# Altium footprint library PCBLIB.PcbLib: 775 footprints (part 14 of 49)
Each footprint in its own frame and in the unit in brackets; x right, y up, seen from the top. Pads: shape width x height; smd on the part's side, far side on the other; paste and mask are expansions set on the pad; w line width, h text height; cw(c..) or ccw(c..) is an arc to the next point about the centre after c.
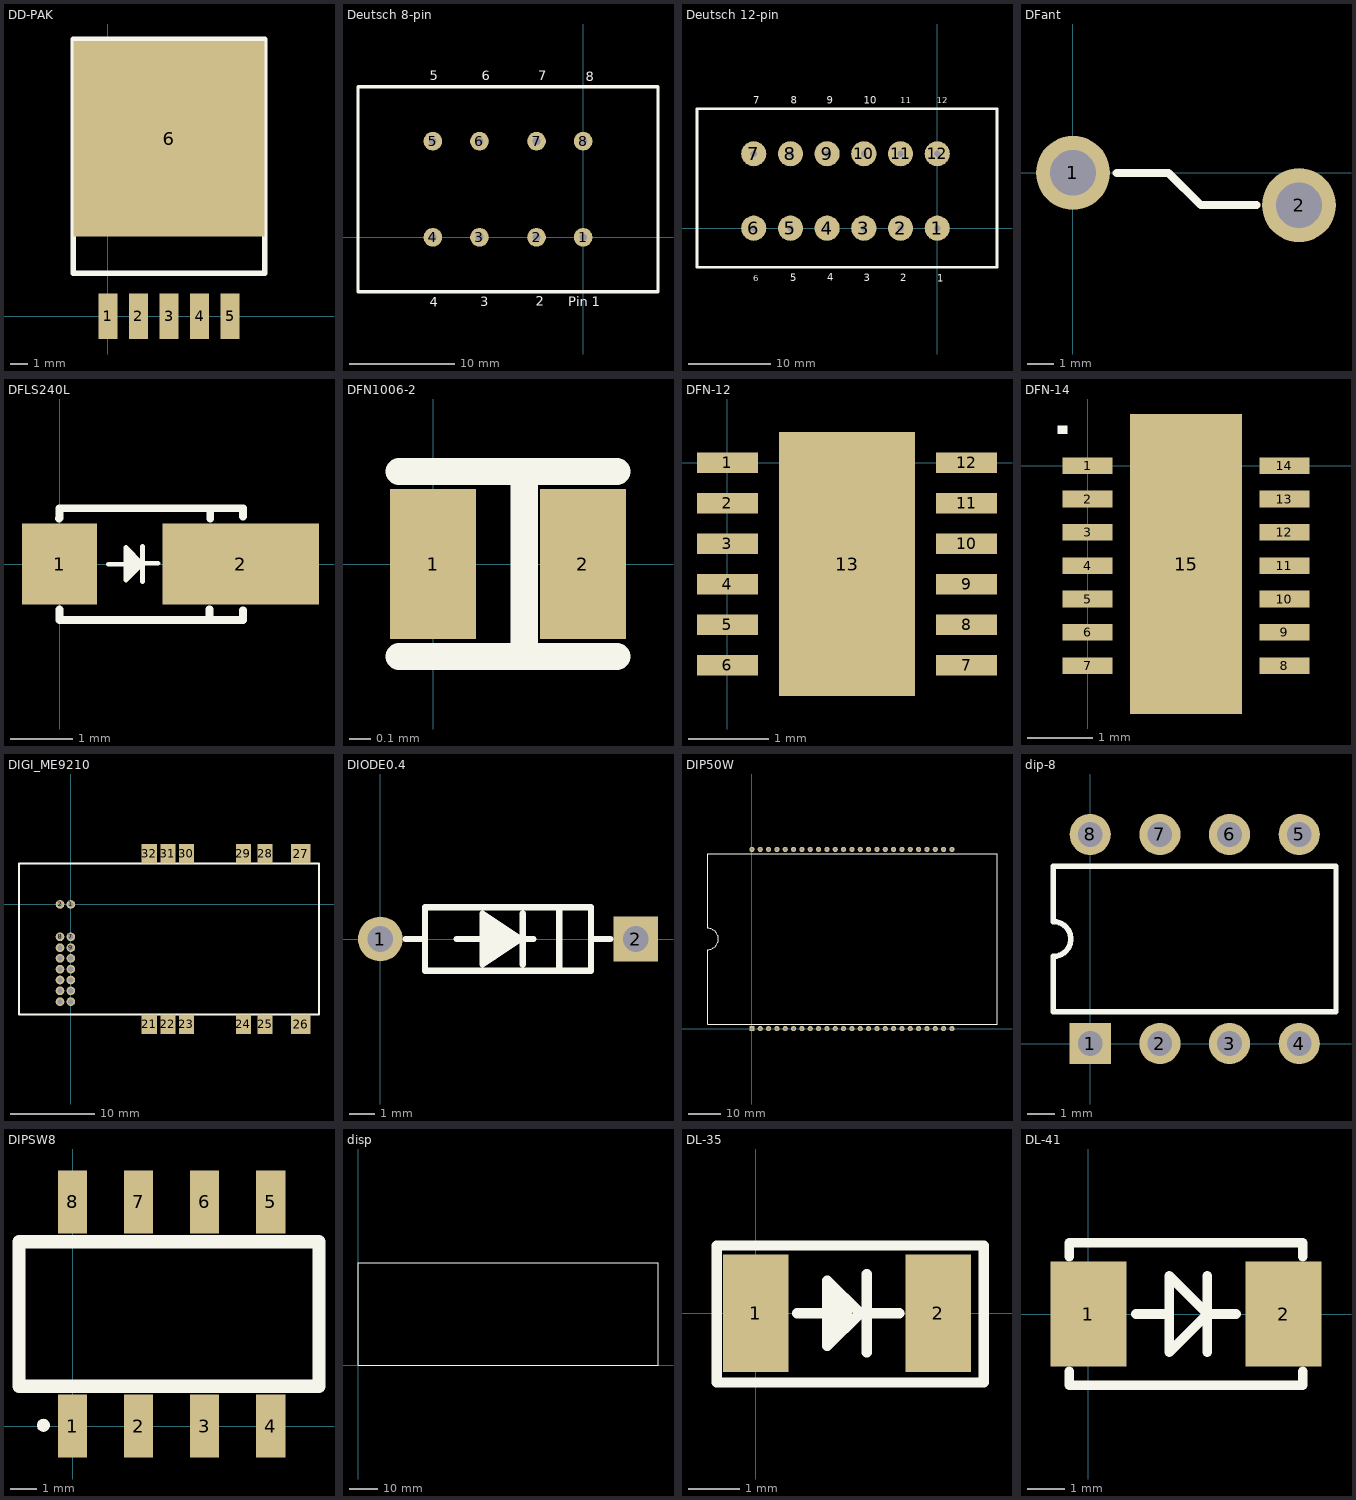
[diagram p13: the footprints below, top view; thin cyan lines are the x and y axes]

## DD-PAK [mil]
pads (6):
  rect 42x100 smd: 1(0,0) 2(67,0) 3(134,0) 4(201,0) 5(268,0)
  rect 420x430 smd: 6(134,390)
TopOverlay:
  lines w12: -76,94 344,94 344,609 -76,609 -76,94
  text "." at -71,-2 h80
Mechanical4:
  text ".110" at 15.6,0.2 h1
  text ".175" at 16,0 h1

## Deutsch 8-pin [mil]
pads (8):
  round 70 hole 29: 1(0,0) 2(-175,0) 3(-389,0) 4(-564,0) 5(-564,361) 6(-389,361) 7(-175,361) 8(0,361)
TopOverlay:
  lines w12: -845,-204.5 281,-204.5 281,565.5 -845,565.5 -845,-204.5
  text "8" at 10,586 h35
  text "4" at -575,-261 h35
  text "3" at -387,-259 h35
  text "2" at -178,-256 h35
  text "5" at -575,589 h35
  text "6" at -380,589 h35
  text "7" at -169,589 h35
  text "Pin 1" at -56,-258 h35

## Deutsch 12-pin [mil]
pads (12):
  round 120 / inner round 70 / far side round 70 hole 29: 1(0,0) 2(-175,0) 3(-350,0) 4(-525,0) 5(-700,0) 6(-875,0) 7(-875,355) 8(-700,355) 9(-525,355) 10(-350,355) 11(-175,355) 12(0,355)
TopOverlay:
  lines w12: -1145.5,-186 285,-186 285,570 -1145.5,570 -1145.5,-186
  text "12" at -2,596 h30
  text "11" at -176,595 h30
  text "6" at -877,-253 h30
  text "5" at -701,-253 h35
  text "8" at -699,593 h35
  text "4" at -525,-250 h35
  text "3" at -351,-253 h35
  text "2" at -177,-253 h35
  text "9" at -527,594 h35
  text "10" at -351,594 h35
  text "7" at -877,593 h35
  text "1" at 0,-255 h35

## DFant [mil]
height 1
pads (2):
  round 110 hole 68: 1(0,0) 2(336,-48)
TopOverlay:
  lines w12: 65,0 142,0 190,-48 273,-48

## DFLS240L [mil]
height 39.37
pads (2):
  rect 47.56x51.34 smd: 1(0,0)
  rect 99.13x51.34 smd: 2(114.69,0)
TopOverlay:
  lines w3: 30.87,-0.11 52.19,-0.11 42.02,-10.28 ; 44.17,4.58 42.02,2.43 42.02,-10.28 ; 44.17,6.15 47.3,3.02 ; 44.36,-5.2 47.49,-2.07 ; 44.36,-4.02 44.36,3.02 ; 46.12,1.84 46.52,1.45 ; 48.28,-0.5 48.28,2.24 ; 52.19,0.28 42.02,10.45 42.02,-10.28 ; 52.58,-11.26 52.58,11.23 ; 52.58,0.47 62.36,0.47
  lines w5: -0.24,28.84 0,29.07 0,35.29 116.22,35.29 ; -0.04,-28.87 -0.04,-35.57 116.22,-35.57 116.22,-29.32 116.15,-29.26 ; 95.03,-28.67 95.03,-35.18 95.42,-35.57 ; 95.42,28.84 95.42,35.29 ; 116.15,30.01 116.15,35.25

## DFN1006-2 [mm] "Fast Switching Diode"
height 55
pads (2):
  rect 0.4x0.7 smd: 1(0,0) 2(0.7,0)
TopOverlay:
  lines w0.127: -0.158,-0.432 0.858,-0.432 ; -0.158,0.432 0.858,0.432 ; 0.426,-0.432 0.426,0.432

## DFN-12 [mil]
height 31
pads (13):
  rect 30x10 smd: 1(0,0) 2(0,-20) 3(0,-40) 4(0,-60) 5(0,-80) 6(0,-100) 7(118,-100) 8(118,-80) 9(118,-60) 10(118,-40) 11(118,-20) 12(118,0)
  rect 67x130 smd: 13(59,-50)

## DFN-14 [mil]
pads (15):
  rect 30x10 smd: 1(0,0) 2(0,-20) 3(0,-40) 4(0,-60) 5(0,-80) 6(0,-100) 7(0,-120) 8(118,-120) 9(118,-100) 10(118,-80) 11(118,-60) 12(118,-40) 13(118,-20) 14(118,0)
  rect 67x180 smd: 15(59,-59)
TopOverlay:
  rectangle: -18,19 -12,24

## DIGI_ME9210 [mil]
height 145
pads (28):
  round 40 hole 25: 1(0,0) 2(-50,0) 7(0,-150) 8(-50,-150) 9(0,-200) 10(-50,-200) 11(0,-250) 12(-50,-250) 13(0,-300) 14(-50,-300) 15(0,-350) 16(-50,-350) 17(0,-400) 18(-50,-400) 19(0,-450) 20(-50,-450)
  rect 71x91 smd: 21(364,-555.5) 22(450,-555.5) 23(536,-555.5) 24(800,-555.5) 25(900,-555.5) 28(900,235.5) 29(800,235.5) 30(536,235.5) 31(450,235.5) 32(364,235.5)
  rect 91x91 smd: 26(1065.5,-555.5) 27(1065.5,235.5)
TopOverlay:
  lines w8: -240,-510 -240,190 -29.22,190 1150,190 1150,-510 -85.07,-510 -238.65,-510 -240,-508.65
BottomOverlay:
  text "." at 29.18,-19.23 h300
  text "1" at 23.89,33.72 h60
  text "2" at -32.09,30.7 h60
  text "20" at -31.33,-529.11 h60
  text "19" at 23.13,-528.35 h60
  text "7" at 20.86,-122.87 h60
  text "8" at -32.09,-123.63 h60

## DIODE0.4 [mil]
pads (2):
  round 70 hole 40: 1(0,0)
  rect 70x70 hole 40: 2(400,0)
TopOverlay:
  lines w10: 40,0 70,0 ; 120,0 160,0 200,0 ; 164,31 188,7 195,7 195,-11 178,-28 164,-28 173,-19 173,14 ; 170,-25 170,25 ; 180,-20 180,20 ; 190,-15 190,15 ; 190,0 210,0 ; 200,-10 200,10 ; 223,-40 223,40 ; 240,0 220,0 ; 280,-50 280,50 ; 330,0 360,0 ; 220,0 160,-40 160,40 220,0 ; 70,-50 330,-50 330,50 70,50 70,-50

## DIP50W [mil]
pads (50):
  rect 62x62 hole 30: 1(0,0)
  round 62 hole 30: 2(100,0) 3(200,0) 4(300,0) 5(400,0) 6(500,0) 7(600,0) 8(700,0) 9(800,0) 10(900,0) 11(1000,0) 12(1100,0) 13(1200,0) 14(1300,0) 15(1400,0) 16(1500,0) 17(1600,0) 18(1700,0) 19(1800,0) 20(1900,0) 21(2000,0) 22(2100,0) 23(2200,0) 24(2300,0) 25(2400,0) 26(2400,2150) 27(2300,2150) 28(2200,2150) 29(2100,2150) 30(2000,2150) 31(1900,2150) 32(1800,2150) 33(1700,2150) 34(1600,2150) 35(1500,2150) 36(1400,2150) 37(1300,2150) 38(1200,2150) 39(1100,2150) 40(1000,2150) 41(900,2150) 42(800,2150) 43(700,2150) 44(600,2150) 45(500,2150) 46(400,2150) 47(300,2150) 48(200,2150) 49(100,2150) 50(0,2150)
TopOverlay:
  lines w12: -530,50 2940,50 2940,2100 -530,2100 -530,1203 cw(c-530,1075) -530,947 -530,50
Mechanical4:
  text ".114" at 0,0 h1

## dip-8 [mm] "DIP; 8 Leads; Row Spacing 7.62 mm; Pitch 2.54 mm"
height 5.08
pads (8):
  rect 1.5x1.5 hole 0.9: 1(0,0)
  round 1.5 hole 0.9: 2(2.54,0) 3(5.08,0) 4(7.62,0) 5(7.62,7.62) 6(5.08,7.62) 7(2.54,7.62) 8(0,7.62)
TopOverlay:
  lines w0.2: -1.34,1.16 -1.34,3.175 ccw(c-1.34,3.81) -1.34,4.445 -1.34,6.46 8.96,6.46 8.96,1.16 -1.34,1.16

## DIPSW8 [mil]
pads (9):
  rect 44x96 smd: 1(0,0) 2(100,0) 3(200,0) 4(300,0) 5(300,339) 6(200,339) 7(100,339) 8(0,339)
  round 20 on Top Overlay: ""(-44,1)
TopOverlay:
  lines w20: -81,60 373,60 373,279 -81,279 -81,60

## disp [mil]
TopOverlay:
  lines w10: 0,0 4200,0 4200,1432 0,1432 0,0
Mechanical4:
  text ".350" at 0,0 h1

## DL-35 [mil]
pads (2):
  rect 50x90 smd: 1(0,0) 2(140,0)
TopOverlay:
  lines w7.99: -30,-52.99 175,-52.99 175,52.01 -30,52.01
  lines w8: -30,-53 -30,52 ; 32,0 55,0 ; 60,15 60,10 60,-15 70,-5 70,5 65,10 65,-5 ; 85,-30 85,30 ; 85,0 110,0 ; 55,-25 80,0 55,25 55,-25
Mechanical4:
  text ".065" at 0,0 h1
  text ".061" at 145,0 h1

## DL-41 [mil]
pads (2):
  rect 80x110 smd: 1(0,0) 2(205,0)
TopOverlay:
  lines w10: -20,-60 -20,-65 -20,-75 225,-75 225,-60 ; -20,60 -20,75 225,75 225,60 ; 50,0 65,0 85,0 ; 125,-40 125,0 ; 125,40 125,0 ; 155,0 145,0 125,0 ; 85,0 85,-40 125,0 ; 85,0 85,40 125,0
Mechanical4:
  text ".1" at 0,0 h1